# Altium footprint library 3M THD.PcbLib: 163 footprints (part 12 of 14)
Each footprint in its own frame and in the unit in brackets; x right, y up, seen from the top. Pads: shape width x height; smd on the part's side, far side on the other; paste and mask are expansions set on the pad; w line width, h text height; cw(c..) or ccw(c..) is an arc to the next point about the centre after c.
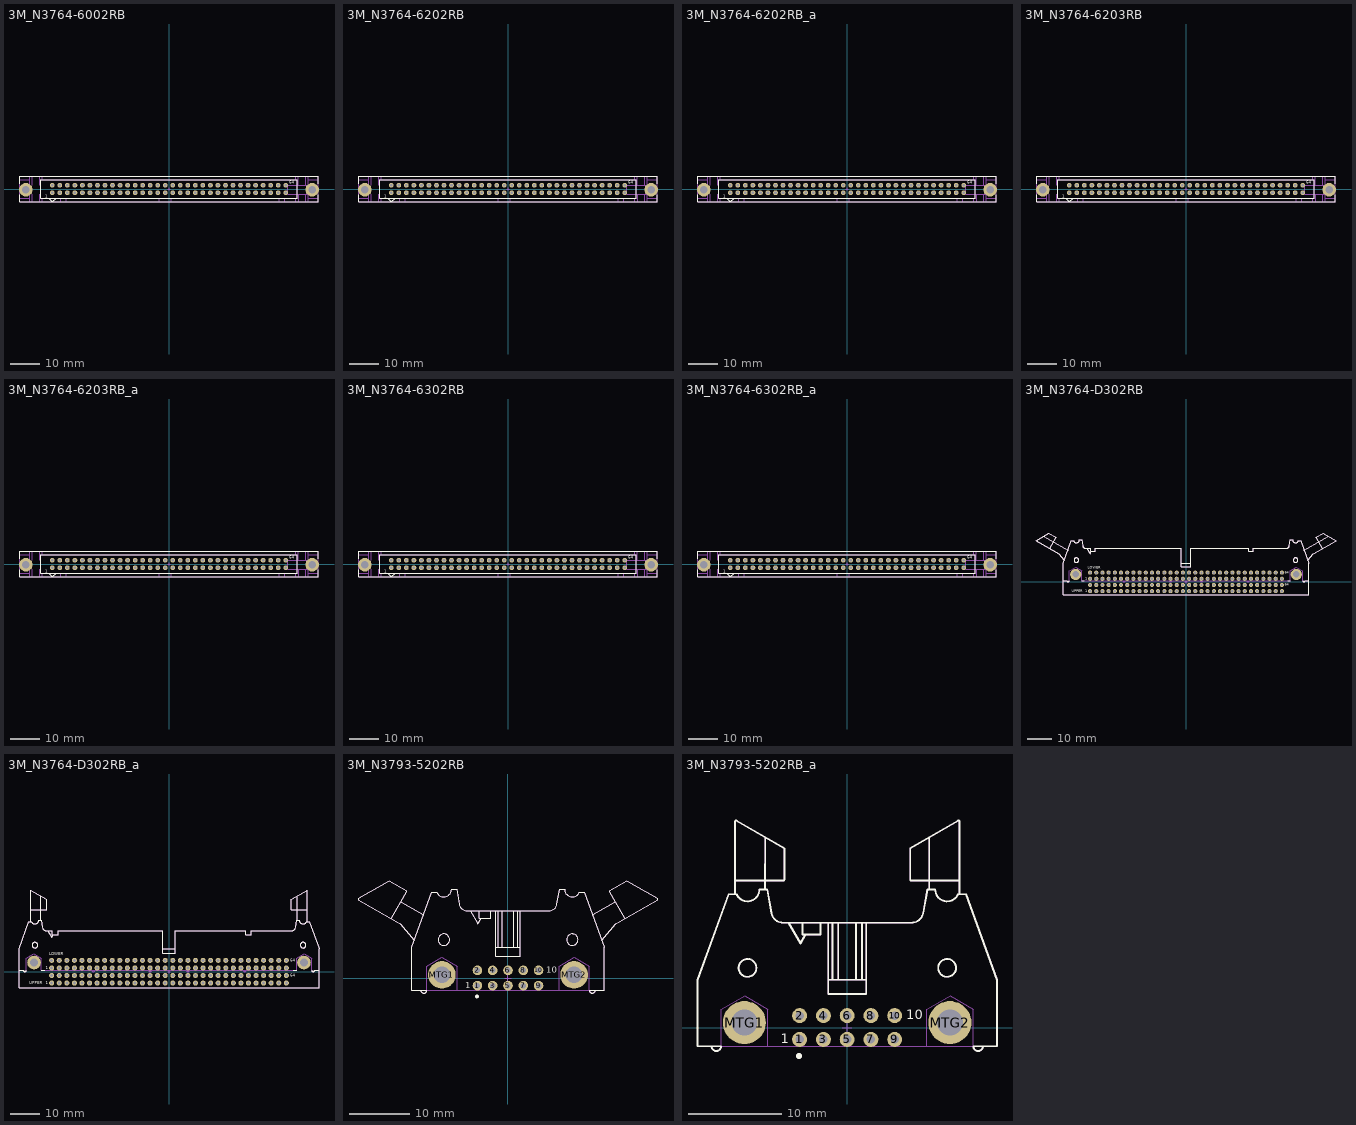
[diagram p11: the footprints below, top view; thin cyan lines are the x and y axes]

## 3M_N3764-6002RB [mm] "3M, 3000 Series, 64 Contacts - Pitch 2.54mm - Straight Four-Wall Header (Black) Without Latch/Ejectors"
height 17.3
pads (66):
  round 1.6 hole 0.9: 1(-39.37,-1.27) 2(-39.37,1.27) 3(-36.83,-1.27) 4(-36.83,1.27) 5(-34.29,-1.27) 6(-34.29,1.27) 7(-31.75,-1.27) 8(-31.75,1.27) 9(-29.21,-1.27) 10(-29.21,1.27) 11(-26.67,-1.27) 12(-26.67,1.27) 13(-24.13,-1.27) 14(-24.13,1.27) 15(-21.59,-1.27) 16(-21.59,1.27) 17(-19.05,-1.27) 18(-19.05,1.27) 19(-16.51,-1.27) 20(-16.51,1.27) 21(-13.97,-1.27) 22(-13.97,1.27) 23(-11.43,-1.27) 24(-11.43,1.27) 25(-8.89,-1.27) 26(-8.89,1.27) 27(-6.35,-1.27) 28(-6.35,1.27) 29(-3.81,-1.27) 30(-3.81,1.27) 31(-1.27,-1.27) 32(-1.27,1.27) 33(1.27,-1.27) 34(1.27,1.27) 35(3.81,-1.27) 36(3.81,1.27) 37(6.35,-1.27) 38(6.35,1.27) 39(8.89,-1.27) 40(8.89,1.27) 41(11.43,-1.27) 42(11.43,1.27) 43(13.97,-1.27) 44(13.97,1.27) 45(16.51,-1.27) 46(16.51,1.27) 47(19.05,-1.27) 48(19.05,1.27) 49(21.59,-1.27) 50(21.59,1.27) 51(24.13,-1.27) 52(24.13,1.27) 53(26.67,-1.27) 54(26.67,1.27) 55(29.21,-1.27) 56(29.21,1.27) 57(31.75,-1.27) 58(31.75,1.27) 59(34.29,-1.27) 60(34.29,1.27) 61(36.83,-1.27) 62(36.83,1.27) 63(39.37,-1.27) 64(39.37,1.27)
  round 4.6 hole 2.6: MTG1(-48.31,-0.254) MTG2(48.31,-0.254)
Top Overlay:
  lines w0.2: -50.292,-2 -50.292,-4.318 50.292,-4.318 50.292,-2 ; -50.292,1.7 -50.292,4.3 50.292,4.3 50.292,1.7 ; -43.307,-3.175 43.307,-3.175 43.307,3.175 -43.307,3.175 -43.307,-3.175 ; -40.64,-3.175 -39.37,-4.318 -38.1,-3.175 -40.64,-3.175
  text "1" at -41.707,-2.921 h1.02
  text "64" at 40.605,1.727 h1.02
Mechanical 8:
  drawing of 276 lines, arcs and shapes, not listed
Mechanical 14:
  circle w0.1: c-48.324,-0.254 r1.27
  circle w0.1: c48.324,-0.254 r1.27
  lines w0.1: -50.292,-3.175 -46.964,-3.175 ; -49.324,-0.254 -48.324,-0.254 ; -48.324,-1.254 -48.324,-0.254 ; -48.324,0.746 -48.324,-0.254 ; -47.324,-0.254 -48.324,-0.254 ; -46.964,-4.318 -46.964,-1.727 ; -46.964,1.27 -46.964,4.318 ; -46.122,-4.318 -46.122,-1.727 ; -46.122,1.27 -46.122,4.318 ; -43.689,-4.318 -43.688,-1.727 ; -43.307,-1.727 -43.307,-3.175 ; -43.307,1.27 -43.307,3.175 ; -36.519,-4.318 -36.519,-3.175 ; -34.601,-4.318 -34.601,-3.175 ; -3.302,-4.318 -3.302,-3.175 ; 0.762,-4.318 0.762,-3.175 ; 37.141,-4.318 37.141,-3.175 ; 39.059,-4.318 39.059,-3.175 ; 42.846,-4.318 42.846,-3.175 ; 42.846,3.175 42.846,4.318 ; 43.307,-1.727 43.307,-3.175 ; 43.307,1.27 43.307,3.175 ; 43.688,1.27 43.688,4.318 ; 43.729,-4.318 43.729,-1.727 ; 46.122,-4.318 46.122,-1.727 ; 46.122,1.27 46.122,4.318 ; 46.964,-4.318 46.964,-1.727 40.005,-1.727 40.005,1.27 46.964,1.27 46.964,4.318 ; 46.964,-3.175 50.292,-3.175 ; 46.964,3.175 50.292,3.175 ; 47.324,-0.254 48.324,-0.254 ; 48.324,-1.254 48.324,-0.254 ; 48.324,0.746 48.324,-0.254 ; 49.324,-0.254 48.324,-0.254 ; -50.292,-4.318 -50.292,4.318 ; -50.292,-4.318 -50.292,4.318 ; -50.292,-4.318 -50.292,4.318 ; -50.292,-4.318 50.292,-4.318 ; -50.292,4.318 50.292,4.318 ; -43.307,-3.175 -43.307,3.175 ; -43.307,-3.175 -43.307,3.175 ; -43.307,-3.175 43.307,-3.175 ; -43.307,3.175 43.307,3.175 ; 43.307,-3.175 43.307,3.175 ; 43.307,-3.175 43.307,3.175 ; 50.292,-4.318 50.292,4.318 ; 50.292,-4.318 50.292,4.318 ; -50.292,3.175 -46.964,3.175 -50.292,3.175 ; -49.848,-1.134 -49.848,0.626 -48.324,1.506 -46.8,0.626 -46.8,-1.134 -48.324,-2.014 -49.848,-1.134 ; -43.688,1.27 -43.688,4.318 -43.688,1.27 ; -42.846,-4.318 -42.846,-3.175 -42.846,-4.318 ; -42.846,3.175 -42.846,4.318 -42.846,3.175 ; 46.8,-1.134 46.8,0.626 48.324,1.506 49.848,0.626 49.848,-1.134 48.324,-2.014 46.8,-1.134
  text "1" at -41.707,-2.921 h1.02
  text "64" at 40.605,1.727 h1.02
3D body "3M_N3764-6002RB.stp": height 17.27, standoff -2.84, extent -50.292,-4.318 50.292,4.318

## 3M_N3764-6202RB [mm] "3M, 3000 Series, 64 Contacts - Pitch 2.54mm - Straight Four-Wall Header (Black) With Short Roll Pin Latch/Ejectors"
height 24.6
pads (66):
  round 1.6 hole 0.9: 1(-39.37,-1.27) 2(-39.37,1.27) 3(-36.83,-1.27) 4(-36.83,1.27) 5(-34.29,-1.27) 6(-34.29,1.27) 7(-31.75,-1.27) 8(-31.75,1.27) 9(-29.21,-1.27) 10(-29.21,1.27) 11(-26.67,-1.27) 12(-26.67,1.27) 13(-24.13,-1.27) 14(-24.13,1.27) 15(-21.59,-1.27) 16(-21.59,1.27) 17(-19.05,-1.27) 18(-19.05,1.27) 19(-16.51,-1.27) 20(-16.51,1.27) 21(-13.97,-1.27) 22(-13.97,1.27) 23(-11.43,-1.27) 24(-11.43,1.27) 25(-8.89,-1.27) 26(-8.89,1.27) 27(-6.35,-1.27) 28(-6.35,1.27) 29(-3.81,-1.27) 30(-3.81,1.27) 31(-1.27,-1.27) 32(-1.27,1.27) 33(1.27,-1.27) 34(1.27,1.27) 35(3.81,-1.27) 36(3.81,1.27) 37(6.35,-1.27) 38(6.35,1.27) 39(8.89,-1.27) 40(8.89,1.27) 41(11.43,-1.27) 42(11.43,1.27) 43(13.97,-1.27) 44(13.97,1.27) 45(16.51,-1.27) 46(16.51,1.27) 47(19.05,-1.27) 48(19.05,1.27) 49(21.59,-1.27) 50(21.59,1.27) 51(24.13,-1.27) 52(24.13,1.27) 53(26.67,-1.27) 54(26.67,1.27) 55(29.21,-1.27) 56(29.21,1.27) 57(31.75,-1.27) 58(31.75,1.27) 59(34.29,-1.27) 60(34.29,1.27) 61(36.83,-1.27) 62(36.83,1.27) 63(39.37,-1.27) 64(39.37,1.27)
  round 4.6 hole 2.6: MTG1(-48.31,-0.254) MTG2(48.31,-0.254)
Top Overlay:
  lines w0.2: -50.292,-2 -50.292,-4.318 50.292,-4.318 50.292,-2 ; -50.292,1.7 -50.292,4.3 50.292,4.3 50.292,1.7 ; -43.307,-3.175 -43.307,3.175 43.307,3.175 43.307,-3.175 -43.307,-3.175 ; -40.64,-3.175 -38.1,-3.175 -39.37,-4.318 -40.64,-3.175
  text "64" at 40.605,1.727 h1.02
  text "1" at -41.707,-2.921 h1.02
Mechanical 8:
  drawing of 276 lines, arcs and shapes, not listed
Mechanical 14:
  circle w0.1: c48.324,-0.254 r1.27
  circle w0.1: c-48.324,-0.254 r1.27
  lines w0.1: -50.292,-3.175 -46.964,-3.175 ; -49.324,-0.254 -48.324,-0.254 ; -48.324,-1.254 -48.324,-0.254 ; -48.324,0.746 -48.324,-0.254 ; -47.324,-0.254 -48.324,-0.254 ; -46.964,-4.318 -46.964,-1.727 ; -46.964,1.27 -46.964,4.318 ; -46.122,-4.318 -46.122,-1.727 ; -46.122,1.27 -46.122,4.318 ; -43.689,-4.318 -43.688,-1.727 ; -43.307,-1.727 -43.307,-3.175 ; -43.307,1.27 -43.307,3.175 ; -36.519,-4.318 -36.519,-3.175 ; -34.601,-4.318 -34.601,-3.175 ; -3.302,-4.318 -3.302,-3.175 ; 0.762,-4.318 0.762,-3.175 ; 37.141,-4.318 37.141,-3.175 ; 39.059,-4.318 39.059,-3.175 ; 42.846,-4.318 42.846,-3.175 ; 42.846,3.175 42.846,4.318 ; 43.307,-1.727 43.307,-3.175 ; 43.307,1.27 43.307,3.175 ; 43.688,1.27 43.688,4.318 ; 43.729,-4.318 43.729,-1.727 ; 46.122,-4.318 46.122,-1.727 ; 46.122,1.27 46.122,4.318 ; 46.964,-4.318 46.964,-1.727 40.005,-1.727 40.005,1.27 46.964,1.27 46.964,4.318 ; 46.964,-3.175 50.292,-3.175 ; 46.964,3.175 50.292,3.175 ; 47.324,-0.254 48.324,-0.254 ; 48.324,-1.254 48.324,-0.254 ; 48.324,0.746 48.324,-0.254 ; 49.324,-0.254 48.324,-0.254 ; -50.292,-4.318 50.292,-4.318 ; -50.292,-4.318 -50.292,4.318 ; -50.292,-4.318 -50.292,4.318 ; -50.292,-4.318 -50.292,4.318 ; -50.292,4.318 50.292,4.318 ; -43.307,-3.175 43.307,-3.175 ; -43.307,-3.175 -43.307,3.175 ; -43.307,-3.175 -43.307,3.175 ; -43.307,3.175 43.307,3.175 ; 43.307,-3.175 43.307,3.175 ; 43.307,-3.175 43.307,3.175 ; 50.292,-4.318 50.292,4.318 ; 50.292,-4.318 50.292,4.318 ; -50.292,3.175 -46.964,3.175 -50.292,3.175 ; -49.848,-1.134 -48.324,-2.014 -46.8,-1.134 -46.8,0.626 -48.324,1.506 -49.848,0.626 -49.848,-1.134 ; -43.688,1.27 -43.688,4.318 -43.688,1.27 ; -42.846,-4.318 -42.846,-3.175 -42.846,-4.318 ; -42.846,3.175 -42.846,4.318 -42.846,3.175 ; 46.8,-1.134 48.324,-2.014 49.848,-1.134 49.848,0.626 48.324,1.506 46.8,0.626 46.8,-1.134
  text "64" at 40.605,1.727 h1.02
  text "1" at -41.707,-2.921 h1.02
3D body "3M_N3764-6202RB.stp": height 18.69, standoff -2.84, extent -59.221,-4.318 59.221,4.318

## 3M_N3764-6202RB_a [mm] "3M, 3000 Series, 64 Contacts - Pitch 2.54mm - Straight Four-Wall Header (Black) With Short Roll Pin Latch/Ejectors"
height 24.6
pads (66):
  round 1.6 hole 0.9: 1(-39.37,-1.27) 2(-39.37,1.27) 3(-36.83,-1.27) 4(-36.83,1.27) 5(-34.29,-1.27) 6(-34.29,1.27) 7(-31.75,-1.27) 8(-31.75,1.27) 9(-29.21,-1.27) 10(-29.21,1.27) 11(-26.67,-1.27) 12(-26.67,1.27) 13(-24.13,-1.27) 14(-24.13,1.27) 15(-21.59,-1.27) 16(-21.59,1.27) 17(-19.05,-1.27) 18(-19.05,1.27) 19(-16.51,-1.27) 20(-16.51,1.27) 21(-13.97,-1.27) 22(-13.97,1.27) 23(-11.43,-1.27) 24(-11.43,1.27) 25(-8.89,-1.27) 26(-8.89,1.27) 27(-6.35,-1.27) 28(-6.35,1.27) 29(-3.81,-1.27) 30(-3.81,1.27) 31(-1.27,-1.27) 32(-1.27,1.27) 33(1.27,-1.27) 34(1.27,1.27) 35(3.81,-1.27) 36(3.81,1.27) 37(6.35,-1.27) 38(6.35,1.27) 39(8.89,-1.27) 40(8.89,1.27) 41(11.43,-1.27) 42(11.43,1.27) 43(13.97,-1.27) 44(13.97,1.27) 45(16.51,-1.27) 46(16.51,1.27) 47(19.05,-1.27) 48(19.05,1.27) 49(21.59,-1.27) 50(21.59,1.27) 51(24.13,-1.27) 52(24.13,1.27) 53(26.67,-1.27) 54(26.67,1.27) 55(29.21,-1.27) 56(29.21,1.27) 57(31.75,-1.27) 58(31.75,1.27) 59(34.29,-1.27) 60(34.29,1.27) 61(36.83,-1.27) 62(36.83,1.27) 63(39.37,-1.27) 64(39.37,1.27)
  round 4.6 hole 2.6: MTG1(-48.31,-0.254) MTG2(48.31,-0.254)
Top Overlay:
  lines w0.2: -50.292,-2 -50.292,-4.318 50.292,-4.318 50.292,-2 ; -50.292,1.7 -50.292,4.3 50.292,4.3 50.292,1.7 ; -43.307,-3.175 43.307,-3.175 43.307,3.175 -43.307,3.175 -43.307,-3.175 ; -40.64,-3.175 -39.37,-4.318 -38.1,-3.175 -40.64,-3.175
  text "1" at -41.707,-2.921 h1.02
  text "64" at 40.605,1.727 h1.02
Mechanical 8:
  drawing of 276 lines, arcs and shapes, not listed
Mechanical 14:
  circle w0.1: c-48.324,-0.254 r1.27
  circle w0.1: c48.324,-0.254 r1.27
  lines w0.1: -50.292,-3.175 -46.964,-3.175 ; -49.324,-0.254 -48.324,-0.254 ; -48.324,-1.254 -48.324,-0.254 ; -48.324,0.746 -48.324,-0.254 ; -47.324,-0.254 -48.324,-0.254 ; -46.964,-4.318 -46.964,-1.727 ; -46.964,1.27 -46.964,4.318 ; -46.122,-4.318 -46.122,-1.727 ; -46.122,1.27 -46.122,4.318 ; -43.689,-4.318 -43.688,-1.727 ; -43.307,-1.727 -43.307,-3.175 ; -43.307,1.27 -43.307,3.175 ; -36.519,-4.318 -36.519,-3.175 ; -34.601,-4.318 -34.601,-3.175 ; -3.302,-4.318 -3.302,-3.175 ; 0.762,-4.318 0.762,-3.175 ; 37.141,-4.318 37.141,-3.175 ; 39.059,-4.318 39.059,-3.175 ; 42.846,-4.318 42.846,-3.175 ; 42.846,3.175 42.846,4.318 ; 43.307,-1.727 43.307,-3.175 ; 43.307,1.27 43.307,3.175 ; 43.688,1.27 43.688,4.318 ; 43.729,-4.318 43.729,-1.727 ; 46.122,-4.318 46.122,-1.727 ; 46.122,1.27 46.122,4.318 ; 46.964,-4.318 46.964,-1.727 40.005,-1.727 40.005,1.27 46.964,1.27 46.964,4.318 ; 46.964,-3.175 50.292,-3.175 ; 46.964,3.175 50.292,3.175 ; 47.324,-0.254 48.324,-0.254 ; 48.324,-1.254 48.324,-0.254 ; 48.324,0.746 48.324,-0.254 ; 49.324,-0.254 48.324,-0.254 ; -50.292,-4.318 -50.292,4.318 ; -50.292,-4.318 -50.292,4.318 ; -50.292,-4.318 -50.292,4.318 ; -50.292,-4.318 50.292,-4.318 ; -50.292,4.318 50.292,4.318 ; -43.307,-3.175 -43.307,3.175 ; -43.307,-3.175 -43.307,3.175 ; -43.307,-3.175 43.307,-3.175 ; -43.307,3.175 43.307,3.175 ; 43.307,-3.175 43.307,3.175 ; 43.307,-3.175 43.307,3.175 ; 50.292,-4.318 50.292,4.318 ; 50.292,-4.318 50.292,4.318 ; -50.292,3.175 -46.964,3.175 -50.292,3.175 ; -49.848,-1.134 -49.848,0.626 -48.324,1.506 -46.8,0.626 -46.8,-1.134 -48.324,-2.014 -49.848,-1.134 ; -43.688,1.27 -43.688,4.318 -43.688,1.27 ; -42.846,-4.318 -42.846,-3.175 -42.846,-4.318 ; -42.846,3.175 -42.846,4.318 -42.846,3.175 ; 46.8,-1.134 46.8,0.626 48.324,1.506 49.848,0.626 49.848,-1.134 48.324,-2.014 46.8,-1.134
  text "1" at -41.707,-2.921 h1.02
  text "64" at 40.605,1.727 h1.02
3D body "3M_N3764-6202RB_a.stp": height 24.64, standoff -2.84, extent -50.292,-4.318 50.292,4.318

## 3M_N3764-6203RB [mm] "3M, 3000 Series, 64 Contacts - Pitch 2.54mm - Straight Four-Wall Header (Black) With Short Roll Pin Latch/Ejectors, Solder Tail 3.94mm"
height 24.6
pads (66):
  round 1.6 hole 0.9: 1(-39.37,-1.27) 2(-39.37,1.27) 3(-36.83,-1.27) 4(-36.83,1.27) 5(-34.29,-1.27) 6(-34.29,1.27) 7(-31.75,-1.27) 8(-31.75,1.27) 9(-29.21,-1.27) 10(-29.21,1.27) 11(-26.67,-1.27) 12(-26.67,1.27) 13(-24.13,-1.27) 14(-24.13,1.27) 15(-21.59,-1.27) 16(-21.59,1.27) 17(-19.05,-1.27) 18(-19.05,1.27) 19(-16.51,-1.27) 20(-16.51,1.27) 21(-13.97,-1.27) 22(-13.97,1.27) 23(-11.43,-1.27) 24(-11.43,1.27) 25(-8.89,-1.27) 26(-8.89,1.27) 27(-6.35,-1.27) 28(-6.35,1.27) 29(-3.81,-1.27) 30(-3.81,1.27) 31(-1.27,-1.27) 32(-1.27,1.27) 33(1.27,-1.27) 34(1.27,1.27) 35(3.81,-1.27) 36(3.81,1.27) 37(6.35,-1.27) 38(6.35,1.27) 39(8.89,-1.27) 40(8.89,1.27) 41(11.43,-1.27) 42(11.43,1.27) 43(13.97,-1.27) 44(13.97,1.27) 45(16.51,-1.27) 46(16.51,1.27) 47(19.05,-1.27) 48(19.05,1.27) 49(21.59,-1.27) 50(21.59,1.27) 51(24.13,-1.27) 52(24.13,1.27) 53(26.67,-1.27) 54(26.67,1.27) 55(29.21,-1.27) 56(29.21,1.27) 57(31.75,-1.27) 58(31.75,1.27) 59(34.29,-1.27) 60(34.29,1.27) 61(36.83,-1.27) 62(36.83,1.27) 63(39.37,-1.27) 64(39.37,1.27)
  round 4.6 hole 2.6: MTG1(-48.31,-0.254) MTG2(48.31,-0.254)
Top Overlay:
  lines w0.2: -50.292,-2 -50.292,-4.318 50.292,-4.318 50.292,-2 ; -50.292,1.7 -50.292,4.3 50.292,4.3 50.292,1.7 ; -43.307,-3.175 -43.307,3.175 43.307,3.175 43.307,-3.175 -43.307,-3.175 ; -40.64,-3.175 -38.1,-3.175 -39.37,-4.318 -40.64,-3.175
  text "64" at 40.605,1.727 h1.02
  text "1" at -41.707,-2.921 h1.02
Mechanical 8:
  drawing of 276 lines, arcs and shapes, not listed
Mechanical 14:
  circle w0.1: c48.324,-0.254 r1.27
  circle w0.1: c-48.324,-0.254 r1.27
  lines w0.1: -50.292,-3.175 -46.964,-3.175 ; -49.324,-0.254 -48.324,-0.254 ; -48.324,-1.254 -48.324,-0.254 ; -48.324,0.746 -48.324,-0.254 ; -47.324,-0.254 -48.324,-0.254 ; -46.964,-4.318 -46.964,-1.727 ; -46.964,1.27 -46.964,4.318 ; -46.122,-4.318 -46.122,-1.727 ; -46.122,1.27 -46.122,4.318 ; -43.689,-4.318 -43.688,-1.727 ; -43.307,-1.727 -43.307,-3.175 ; -43.307,1.27 -43.307,3.175 ; -36.519,-4.318 -36.519,-3.175 ; -34.601,-4.318 -34.601,-3.175 ; -3.302,-4.318 -3.302,-3.175 ; 0.762,-4.318 0.762,-3.175 ; 37.141,-4.318 37.141,-3.175 ; 39.059,-4.318 39.059,-3.175 ; 42.846,-4.318 42.846,-3.175 ; 42.846,3.175 42.846,4.318 ; 43.307,-1.727 43.307,-3.175 ; 43.307,1.27 43.307,3.175 ; 43.688,1.27 43.688,4.318 ; 43.729,-4.318 43.729,-1.727 ; 46.122,-4.318 46.122,-1.727 ; 46.122,1.27 46.122,4.318 ; 46.964,-4.318 46.964,-1.727 40.005,-1.727 40.005,1.27 46.964,1.27 46.964,4.318 ; 46.964,-3.175 50.292,-3.175 ; 46.964,3.175 50.292,3.175 ; 47.324,-0.254 48.324,-0.254 ; 48.324,-1.254 48.324,-0.254 ; 48.324,0.746 48.324,-0.254 ; 49.324,-0.254 48.324,-0.254 ; -50.292,-4.318 50.292,-4.318 ; -50.292,-4.318 -50.292,4.318 ; -50.292,-4.318 -50.292,4.318 ; -50.292,-4.318 -50.292,4.318 ; -50.292,4.318 50.292,4.318 ; -43.307,-3.175 43.307,-3.175 ; -43.307,-3.175 -43.307,3.175 ; -43.307,-3.175 -43.307,3.175 ; -43.307,3.175 43.307,3.175 ; 43.307,-3.175 43.307,3.175 ; 43.307,-3.175 43.307,3.175 ; 50.292,-4.318 50.292,4.318 ; 50.292,-4.318 50.292,4.318 ; -50.292,3.175 -46.964,3.175 -50.292,3.175 ; -49.848,-1.134 -48.324,-2.014 -46.8,-1.134 -46.8,0.626 -48.324,1.506 -49.848,0.626 -49.848,-1.134 ; -43.688,1.27 -43.688,4.318 -43.688,1.27 ; -42.846,-4.318 -42.846,-3.175 -42.846,-4.318 ; -42.846,3.175 -42.846,4.318 -42.846,3.175 ; 46.8,-1.134 48.324,-2.014 49.848,-1.134 49.848,0.626 48.324,1.506 46.8,0.626 46.8,-1.134
  text "64" at 40.605,1.727 h1.02
  text "1" at -41.707,-2.921 h1.02
3D body "3M_N3764-6203RB.stp": height 18.69, standoff -3.94, extent -59.221,-4.318 59.221,4.318

## 3M_N3764-6203RB_a [mm] "3M, 3000 Series, 64 Contacts - Pitch 2.54mm - Straight Four-Wall Header (Black) With Short Roll Pin Latch/Ejectors, Solder Tail 3.94mm"
height 24.6
pads (66):
  round 1.6 hole 0.9: 1(-39.37,-1.27) 2(-39.37,1.27) 3(-36.83,-1.27) 4(-36.83,1.27) 5(-34.29,-1.27) 6(-34.29,1.27) 7(-31.75,-1.27) 8(-31.75,1.27) 9(-29.21,-1.27) 10(-29.21,1.27) 11(-26.67,-1.27) 12(-26.67,1.27) 13(-24.13,-1.27) 14(-24.13,1.27) 15(-21.59,-1.27) 16(-21.59,1.27) 17(-19.05,-1.27) 18(-19.05,1.27) 19(-16.51,-1.27) 20(-16.51,1.27) 21(-13.97,-1.27) 22(-13.97,1.27) 23(-11.43,-1.27) 24(-11.43,1.27) 25(-8.89,-1.27) 26(-8.89,1.27) 27(-6.35,-1.27) 28(-6.35,1.27) 29(-3.81,-1.27) 30(-3.81,1.27) 31(-1.27,-1.27) 32(-1.27,1.27) 33(1.27,-1.27) 34(1.27,1.27) 35(3.81,-1.27) 36(3.81,1.27) 37(6.35,-1.27) 38(6.35,1.27) 39(8.89,-1.27) 40(8.89,1.27) 41(11.43,-1.27) 42(11.43,1.27) 43(13.97,-1.27) 44(13.97,1.27) 45(16.51,-1.27) 46(16.51,1.27) 47(19.05,-1.27) 48(19.05,1.27) 49(21.59,-1.27) 50(21.59,1.27) 51(24.13,-1.27) 52(24.13,1.27) 53(26.67,-1.27) 54(26.67,1.27) 55(29.21,-1.27) 56(29.21,1.27) 57(31.75,-1.27) 58(31.75,1.27) 59(34.29,-1.27) 60(34.29,1.27) 61(36.83,-1.27) 62(36.83,1.27) 63(39.37,-1.27) 64(39.37,1.27)
  round 4.6 hole 2.6: MTG1(-48.31,-0.254) MTG2(48.31,-0.254)
Top Overlay:
  lines w0.2: -50.292,-2 -50.292,-4.318 50.292,-4.318 50.292,-2 ; -50.292,1.7 -50.292,4.3 50.292,4.3 50.292,1.7 ; -43.307,-3.175 43.307,-3.175 43.307,3.175 -43.307,3.175 -43.307,-3.175 ; -40.64,-3.175 -39.37,-4.318 -38.1,-3.175 -40.64,-3.175
  text "1" at -41.707,-2.921 h1.02
  text "64" at 40.605,1.727 h1.02
Mechanical 8:
  drawing of 276 lines, arcs and shapes, not listed
Mechanical 14:
  circle w0.1: c-48.324,-0.254 r1.27
  circle w0.1: c48.324,-0.254 r1.27
  lines w0.1: -50.292,-3.175 -46.964,-3.175 ; -49.324,-0.254 -48.324,-0.254 ; -48.324,-1.254 -48.324,-0.254 ; -48.324,0.746 -48.324,-0.254 ; -47.324,-0.254 -48.324,-0.254 ; -46.964,-4.318 -46.964,-1.727 ; -46.964,1.27 -46.964,4.318 ; -46.122,-4.318 -46.122,-1.727 ; -46.122,1.27 -46.122,4.318 ; -43.689,-4.318 -43.688,-1.727 ; -43.307,-1.727 -43.307,-3.175 ; -43.307,1.27 -43.307,3.175 ; -36.519,-4.318 -36.519,-3.175 ; -34.601,-4.318 -34.601,-3.175 ; -3.302,-4.318 -3.302,-3.175 ; 0.762,-4.318 0.762,-3.175 ; 37.141,-4.318 37.141,-3.175 ; 39.059,-4.318 39.059,-3.175 ; 42.846,-4.318 42.846,-3.175 ; 42.846,3.175 42.846,4.318 ; 43.307,-1.727 43.307,-3.175 ; 43.307,1.27 43.307,3.175 ; 43.688,1.27 43.688,4.318 ; 43.729,-4.318 43.729,-1.727 ; 46.122,-4.318 46.122,-1.727 ; 46.122,1.27 46.122,4.318 ; 46.964,-4.318 46.964,-1.727 40.005,-1.727 40.005,1.27 46.964,1.27 46.964,4.318 ; 46.964,-3.175 50.292,-3.175 ; 46.964,3.175 50.292,3.175 ; 47.324,-0.254 48.324,-0.254 ; 48.324,-1.254 48.324,-0.254 ; 48.324,0.746 48.324,-0.254 ; 49.324,-0.254 48.324,-0.254 ; -50.292,-4.318 -50.292,4.318 ; -50.292,-4.318 -50.292,4.318 ; -50.292,-4.318 -50.292,4.318 ; -50.292,-4.318 50.292,-4.318 ; -50.292,4.318 50.292,4.318 ; -43.307,-3.175 -43.307,3.175 ; -43.307,-3.175 -43.307,3.175 ; -43.307,-3.175 43.307,-3.175 ; -43.307,3.175 43.307,3.175 ; 43.307,-3.175 43.307,3.175 ; 43.307,-3.175 43.307,3.175 ; 50.292,-4.318 50.292,4.318 ; 50.292,-4.318 50.292,4.318 ; -50.292,3.175 -46.964,3.175 -50.292,3.175 ; -49.848,-1.134 -49.848,0.626 -48.324,1.506 -46.8,0.626 -46.8,-1.134 -48.324,-2.014 -49.848,-1.134 ; -43.688,1.27 -43.688,4.318 -43.688,1.27 ; -42.846,-4.318 -42.846,-3.175 -42.846,-4.318 ; -42.846,3.175 -42.846,4.318 -42.846,3.175 ; 46.8,-1.134 46.8,0.626 48.324,1.506 49.848,0.626 49.848,-1.134 48.324,-2.014 46.8,-1.134
  text "1" at -41.707,-2.921 h1.02
  text "64" at 40.605,1.727 h1.02
3D body "3M_N3764-6203RB_a.stp": height 24.64, standoff -3.94, extent -50.292,-4.318 50.292,4.318

## 3M_N3764-6302RB [mm] "3M, 3000 Series, 64 Contacts - Pitch 2.54mm - Straight Four-Wall Header (Black) With Long Roll Pin Latch/Ejectors"
height 27.2
pads (66):
  round 1.6 hole 0.9: 1(-39.37,-1.27) 2(-39.37,1.27) 3(-36.83,-1.27) 4(-36.83,1.27) 5(-34.29,-1.27) 6(-34.29,1.27) 7(-31.75,-1.27) 8(-31.75,1.27) 9(-29.21,-1.27) 10(-29.21,1.27) 11(-26.67,-1.27) 12(-26.67,1.27) 13(-24.13,-1.27) 14(-24.13,1.27) 15(-21.59,-1.27) 16(-21.59,1.27) 17(-19.05,-1.27) 18(-19.05,1.27) 19(-16.51,-1.27) 20(-16.51,1.27) 21(-13.97,-1.27) 22(-13.97,1.27) 23(-11.43,-1.27) 24(-11.43,1.27) 25(-8.89,-1.27) 26(-8.89,1.27) 27(-6.35,-1.27) 28(-6.35,1.27) 29(-3.81,-1.27) 30(-3.81,1.27) 31(-1.27,-1.27) 32(-1.27,1.27) 33(1.27,-1.27) 34(1.27,1.27) 35(3.81,-1.27) 36(3.81,1.27) 37(6.35,-1.27) 38(6.35,1.27) 39(8.89,-1.27) 40(8.89,1.27) 41(11.43,-1.27) 42(11.43,1.27) 43(13.97,-1.27) 44(13.97,1.27) 45(16.51,-1.27) 46(16.51,1.27) 47(19.05,-1.27) 48(19.05,1.27) 49(21.59,-1.27) 50(21.59,1.27) 51(24.13,-1.27) 52(24.13,1.27) 53(26.67,-1.27) 54(26.67,1.27) 55(29.21,-1.27) 56(29.21,1.27) 57(31.75,-1.27) 58(31.75,1.27) 59(34.29,-1.27) 60(34.29,1.27) 61(36.83,-1.27) 62(36.83,1.27) 63(39.37,-1.27) 64(39.37,1.27)
  round 4.6 hole 2.6: MTG1(-48.31,-0.254) MTG2(48.31,-0.254)
Top Overlay:
  lines w0.2: -50.292,-2 -50.292,-4.318 50.292,-4.318 50.292,-2 ; -50.292,1.7 -50.292,4.3 50.292,4.3 50.292,1.7 ; -43.307,-3.175 -43.307,3.175 43.307,3.175 43.307,-3.175 -43.307,-3.175 ; -40.64,-3.175 -38.1,-3.175 -39.37,-4.318 -40.64,-3.175
  text "64" at 40.605,1.727 h1.02
  text "1" at -41.707,-2.921 h1.02
Mechanical 8:
  drawing of 276 lines, arcs and shapes, not listed
Mechanical 14:
  circle w0.1: c48.324,-0.254 r1.27
  circle w0.1: c-48.324,-0.254 r1.27
  lines w0.1: -50.292,-3.175 -46.964,-3.175 ; -49.324,-0.254 -48.324,-0.254 ; -48.324,-1.254 -48.324,-0.254 ; -48.324,0.746 -48.324,-0.254 ; -47.324,-0.254 -48.324,-0.254 ; -46.964,-4.318 -46.964,-1.727 ; -46.964,1.27 -46.964,4.318 ; -46.122,-4.318 -46.122,-1.727 ; -46.122,1.27 -46.122,4.318 ; -43.689,-4.318 -43.688,-1.727 ; -43.307,-1.727 -43.307,-3.175 ; -43.307,1.27 -43.307,3.175 ; -36.519,-4.318 -36.519,-3.175 ; -34.601,-4.318 -34.601,-3.175 ; -3.302,-4.318 -3.302,-3.175 ; 0.762,-4.318 0.762,-3.175 ; 37.141,-4.318 37.141,-3.175 ; 39.059,-4.318 39.059,-3.175 ; 42.846,-4.318 42.846,-3.175 ; 42.846,3.175 42.846,4.318 ; 43.307,-1.727 43.307,-3.175 ; 43.307,1.27 43.307,3.175 ; 43.688,1.27 43.688,4.318 ; 43.729,-4.318 43.729,-1.727 ; 46.122,-4.318 46.122,-1.727 ; 46.122,1.27 46.122,4.318 ; 46.964,-4.318 46.964,-1.727 40.005,-1.727 40.005,1.27 46.964,1.27 46.964,4.318 ; 46.964,-3.175 50.292,-3.175 ; 46.964,3.175 50.292,3.175 ; 47.324,-0.254 48.324,-0.254 ; 48.324,-1.254 48.324,-0.254 ; 48.324,0.746 48.324,-0.254 ; 49.324,-0.254 48.324,-0.254 ; -50.292,-4.318 50.292,-4.318 ; -50.292,-4.318 -50.292,4.318 ; -50.292,-4.318 -50.292,4.318 ; -50.292,-4.318 -50.292,4.318 ; -50.292,4.318 50.292,4.318 ; -43.307,-3.175 43.307,-3.175 ; -43.307,-3.175 -43.307,3.175 ; -43.307,-3.175 -43.307,3.175 ; -43.307,3.175 43.307,3.175 ; 43.307,-3.175 43.307,3.175 ; 43.307,-3.175 43.307,3.175 ; 50.292,-4.318 50.292,4.318 ; 50.292,-4.318 50.292,4.318 ; -50.292,3.175 -46.964,3.175 -50.292,3.175 ; -49.848,-1.134 -48.324,-2.014 -46.8,-1.134 -46.8,0.626 -48.324,1.506 -49.848,0.626 -49.848,-1.134 ; -43.688,1.27 -43.688,4.318 -43.688,1.27 ; -42.846,-4.318 -42.846,-3.175 -42.846,-4.318 ; -42.846,3.175 -42.846,4.318 -42.846,3.175 ; 46.8,-1.134 48.324,-2.014 49.848,-1.134 49.848,0.626 48.324,1.506 46.8,0.626 46.8,-1.134